# Altium footprint library 开关_按键封装库.PcbLib: 175 footprints (part 2 of 11)
Each footprint in its own frame and in the unit in brackets; x right, y up, seen from the top. Pads: shape width x height; smd on the part's side, far side on the other; paste and mask are expansions set on the pad; w line width, h text height; cw(c..) or ccw(c..) is an arc to the next point about the centre after c.
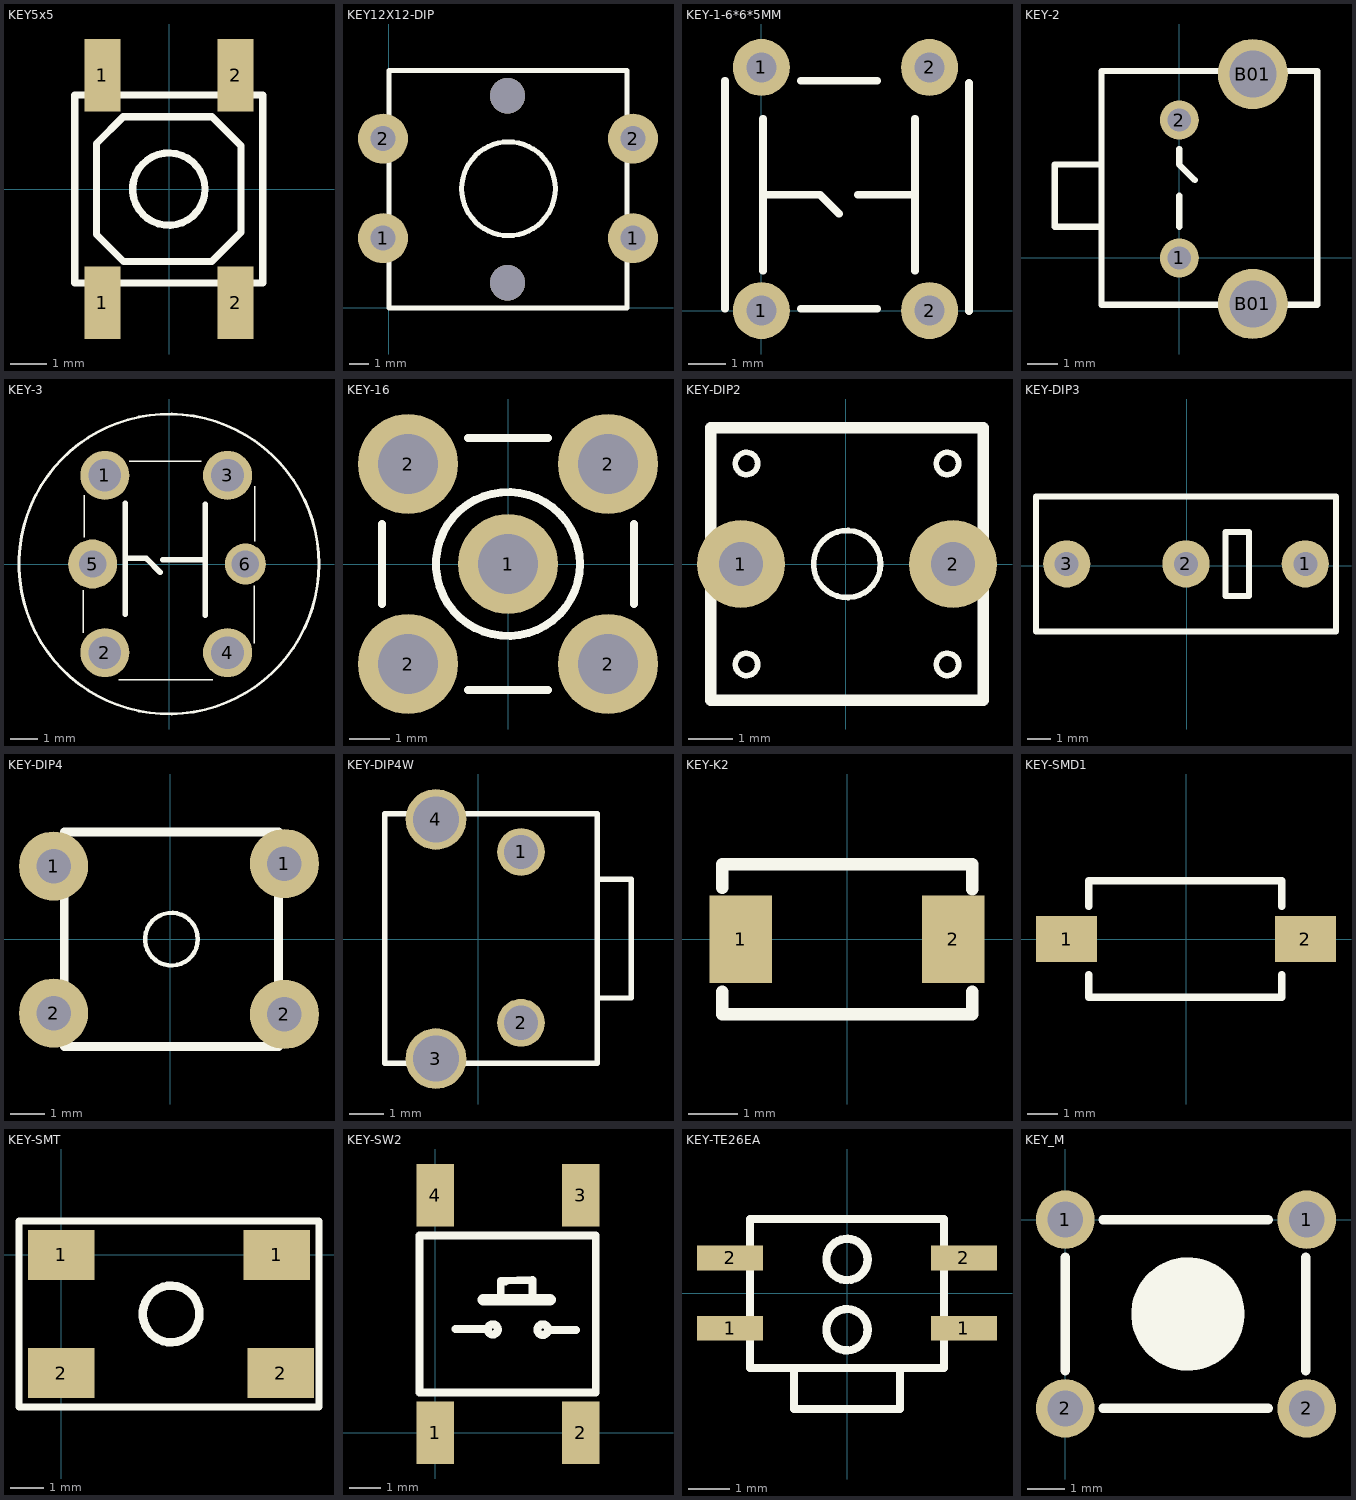
[diagram p1: the footprints below, top view; thin cyan lines are the x and y axes]

## KEY5x5 [mm]
pads (4):
  rect 1x2 smd: 1(-1.841,-3.15) 1(-1.841,3.15) 2(1.841,-3.15) 2(1.841,3.15)
Top Overlay:
  circle w0.2: c-0.007,-0.003 r1
  lines w0.2: -2.607,-2.603 -2.607,2.597 2.593,2.597 2.593,-2.603 -2.607,-2.603 ; -2.007,-1.257 -1.261,-2.003 1.185,-2.003 1.993,-1.194 1.993,1.194 1.19,1.997 -1.267,1.997 -2.007,1.257 -2.007,-1.257
3D body: height 1.2, standoff 0, extent -2.6,-2.6 2.6,2.6
3D body: height 2.5, standoff 1.2, extent -0.992,-0.998 1,0.998

## KEY12X12-DIP [mm]
pads (4):
  round 2.54 hole 1.27: 1(-0.303,3.532) 1(12.397,3.532) 2(-0.303,8.588) 2(12.397,8.588)
via 6.02,10.77 diameter 1.8 hole 1.8
via 6.02,1.27 diameter 1.8 hole 1.8
Top Overlay:
  circle w0.254: c6.071,6.045 r2.378
  lines w0.254: 0,0 12.09,0 12.09,12.065 0,12.065 0,0
3D body "SWT9-1.step": height 7.3, standoff -3.5, extent -0.455,0 12.545,12

## KEY-1-6*6*5MM [mm]
pads (4):
  round 1.524 hole 0.8: 1(0,0) 1(0,6.5) 2(4.5,0) 2(4.5,6.5)
Top Overlay:
  lines w0.203: -0.971,0.044 -0.971,6.14 ; 0.045,1.06 0.045,5.124 ; 0.045,3.092 1.569,3.092 2.077,2.584 ; 1.061,0.044 3.093,0.044 ; 1.061,6.14 3.093,6.14 ; 2.585,3.092 4.109,3.092 ; 4.109,1.06 4.109,5.124 ; 5.553,-0.012 5.553,6.084

## KEY-2 [mil]
pads (4):
  round 50 hole 30: 1(0,0) 2(0,177.16)
  round 90 hole 60: B01(94.49,-59.05) B01(94.49,236.22)
Top Overlay:
  lines w8: -100,40 -160,40 -160,120 -100,120 ; 0,40 0,80 ; 0,140 0,120 20,100 ; 59.05,-60 -100,-60 -100,240 59.05,240 ; 140,-60 177.16,-60 177.16,240 140,240

## KEY-3 [mm]
pads (6):
  round 1.8 hole 1.2: 1(-2.352,3.25) 2(-2.352,-3.25) 3(2.148,3.25) 4(2.148,-3.25)
  round 1.8 hole 1: 5(-2.8,0)
  round 1.5 hole 1: 6(2.8,0)
Top Overlay:
  circle w0.1: c0,0 r5.5
  lines w0.051: -3.153,-2.514 -3.153,-0.957 ; -3.105,0.973 -3.105,2.517 ; -1.838,-4.239 1.612,-4.239 ; -1.464,3.76 1.178,3.76 ; 3.12,-2.899 3.12,-0.8 ; 3.145,0.84 3.145,2.854
  lines w0.203: -1.601,-1.837 -1.601,2.227 ; -1.601,0.208 -0.828,0.202 -0.32,-0.306 ; -0.231,0.15 1.293,0.15 ; 1.327,-1.88 1.327,2.184

## KEY-16 [mm]
pads (5):
  round 2.5 hole 1.5: 1(0,0) 2(-2.5,-2.5) 2(-2.5,2.5) 2(2.5,-2.5) 2(2.5,2.5)
Top Overlay:
  circle w0.2: c0,0 r1.8
  lines w0.2: -3.15,-1 -3.15,1 ; -1,-3.15 1,-3.15 ; -1,3.15 1,3.15 ; 3.15,-1 3.15,1
Mechanical 1:
  circle w0.025: c0,0 r1.8
  circle w0.025: c0,0 r1.05
  circle w0.025: c0,0 r0.2

## KEY-DIP2 [mm] "6X6"
pads (2):
  round 2 hole 1: 1(-2.379,0.004) 2(2.447,0.004)
Top Overlay:
  circle w0.127: c0.034,0.004 r0.762
  circle w0.127: c-2.252,2.29 r0.254
  circle w0.127: c2.32,2.29 r0.254
  circle w0.127: c2.32,-2.282 r0.254
  circle w0.127: c-2.252,-2.282 r0.254
  lines w0.254: -3.065,-3.095 3.133,-3.095 3.133,3.103 -3.065,3.103 -3.065,-3.095
3D body "SW6X6.stp": height 4.3, standoff -14, extent -2.949,-3.097 3.051,3.103

## KEY-DIP3 [mm]
pads (3):
  round 2 hole 1.016: 1(5.029,0.087) 3(-5.071,0.087)
  oval 2.007x2 hole 1.016: 2(-0.021,0.087)
Top Overlay:
  lines w0.254: -6.371,-2.773 6.329,-2.773 ; -6.371,-2.763 -6.371,2.937 6.329,2.937 6.329,-2.763 ; 1.649,-1.263 2.649,-1.263 2.649,1.437 1.649,1.437 1.649,-1.263
3D body "33308.stp": height 14.5, standoff -3.5, extent -6.375,-2.798 6.425,3.002

## KEY-DIP4 [mm] "6X6"
pads (4):
  round 2 hole 1: 1(-3.373,2.116) 1(3.299,2.189) 2(-3.373,-2.134) 2(3.299,-2.172)
Top Overlay:
  circle w0.127: c0.034,0.004 r0.762
  lines w0.254: -3.065,-3.095 3.133,-3.095 3.133,3.103 -3.065,3.103 -3.065,-3.095
3D body "4pin_TS-1143-WP.STEP": height 4.3, standoff -3.5, extent -4.125,-3.27 4.143,3.23

## KEY-DIP4W [mil]
pads (4):
  round 55 hole 39.37: 1(49,100.3) 2(49,-96.56)
  round 70 hole 53.15: 3(-49,-137.8) 4(-49,137.8)
Top Overlay:
  lines w6: 136.84,-68.06 176,-68.06 176,68.94 136.84,68.94 ; -108,-143.06 136.84,-143.06 136.84,144.35 -108,144.35 -108,-143.06
3D body "B3F_3100.STEP": height 137.8, standoff -291.34, extent -108.48,-166.84 173.02,175.68

## KEY-K2 [mil]
pads (2):
  rect 50x70 smd: 1(-85,0) 2(85,0)
Top Overlay:
  lines w10: -100,-42 -100,-60 100,-60 100,-42 ; -100,41 -100,60 100,60 100,40
3D body "SW.STEP": height 78.74, standoff -3.94, extent -97.6,-58 97.6,60.11

## KEY-SMD1 [mm]
pads (2):
  rect 2x1.5 smd: 1(-3.9,0) 2(3.9,0)
Top Overlay:
  lines w0.254: -3.175,-1.168 -3.175,-1.9 3.125,-1.9 3.125,-1.168 ; -3.175,1.067 -3.175,1.9 3.125,1.9 3.125,1.067
3D body "SMD按键.STEP": height 2.5, standoff 0, extent -3.959,-1.945 3.931,1.905

## KEY-SMT [mm]
pads (4):
  rect 2x1.5 smd: 1(0,0) 1(6.477,0) 2(0,-3.556) 2(6.604,-3.556)
Top Overlay:
  circle w0.254: c3.302,-1.778 r0.852
  lines w0.2: -1.27,-4.572 -1.27,1.016 7.747,1.016 7.747,-4.572 -1.27,-4.572
3D body "skqgake010.stp": height 1.5, standoff 0, extent 0.102,-4.378 6.502,0.822

## KEY-SW2 [mm]
pads (4):
  rect 1.2x2 smd: 1(0,0) 2(4.664,0) 3(4.664,7.62) 4(0,7.62)
Top Overlay:
  circle w0.254: c3.445,3.309 r0.17
  lines w0.254: 0.651,3.327 1.616,3.327 ; 1.828,3.479 ccw(c1.845,3.317) 1.845,3.48 ; 2.099,4.267 2.099,4.877 3.115,4.902 3.115,4.318 ; 2.226,4.877 2.251,4.851 ; 3.724,3.302 4.512,3.302 ; -0.508,1.295 -0.508,6.325 5.147,6.325 5.147,1.295 -0.508,1.295
  lines w0.381: 1.54,4.267 3.673,4.267

## KEY-TE26EA [mm]
pads (4):
  rect 1.6x0.6 smd: 1(-2.832,-0.851) 1(2.832,-0.851) 2(-2.832,0.851) 2(2.832,0.851)
Top Overlay:
  circle w0.2: c0,0.813 r0.5
  circle w0.2: c0,-0.889 r0.5
  lines w0.2: -1.283,-1.836 -1.283,-2.807 1.283,-2.807 1.283,-1.836 ; -2.349,-1.816 -2.349,1.791 2.349,1.791 2.349,-1.816 -2.349,-1.816
3D body "零": height 1.63, standoff -0.02, extent -2.941,-2.807 2.959,1.693

## KEY_M [mil]
pads (4):
  round 62 hole 38: 1(0,0) 1(255.91,0) 2(0,-200) 2(255.91,-200)
Top Overlay:
  circle w60: c130,-100 r30
  lines w10: -0.03,-160 -0.03,-40 ; 39.97,-200 215,-200 ; 39.97,0 215,0 ; 255,-160 255,-40